# Altium schematic symbol library robopoly.SCHLIB: 56 symbols
Pins are listed as number, name and electrical type; pins without a type are passive.

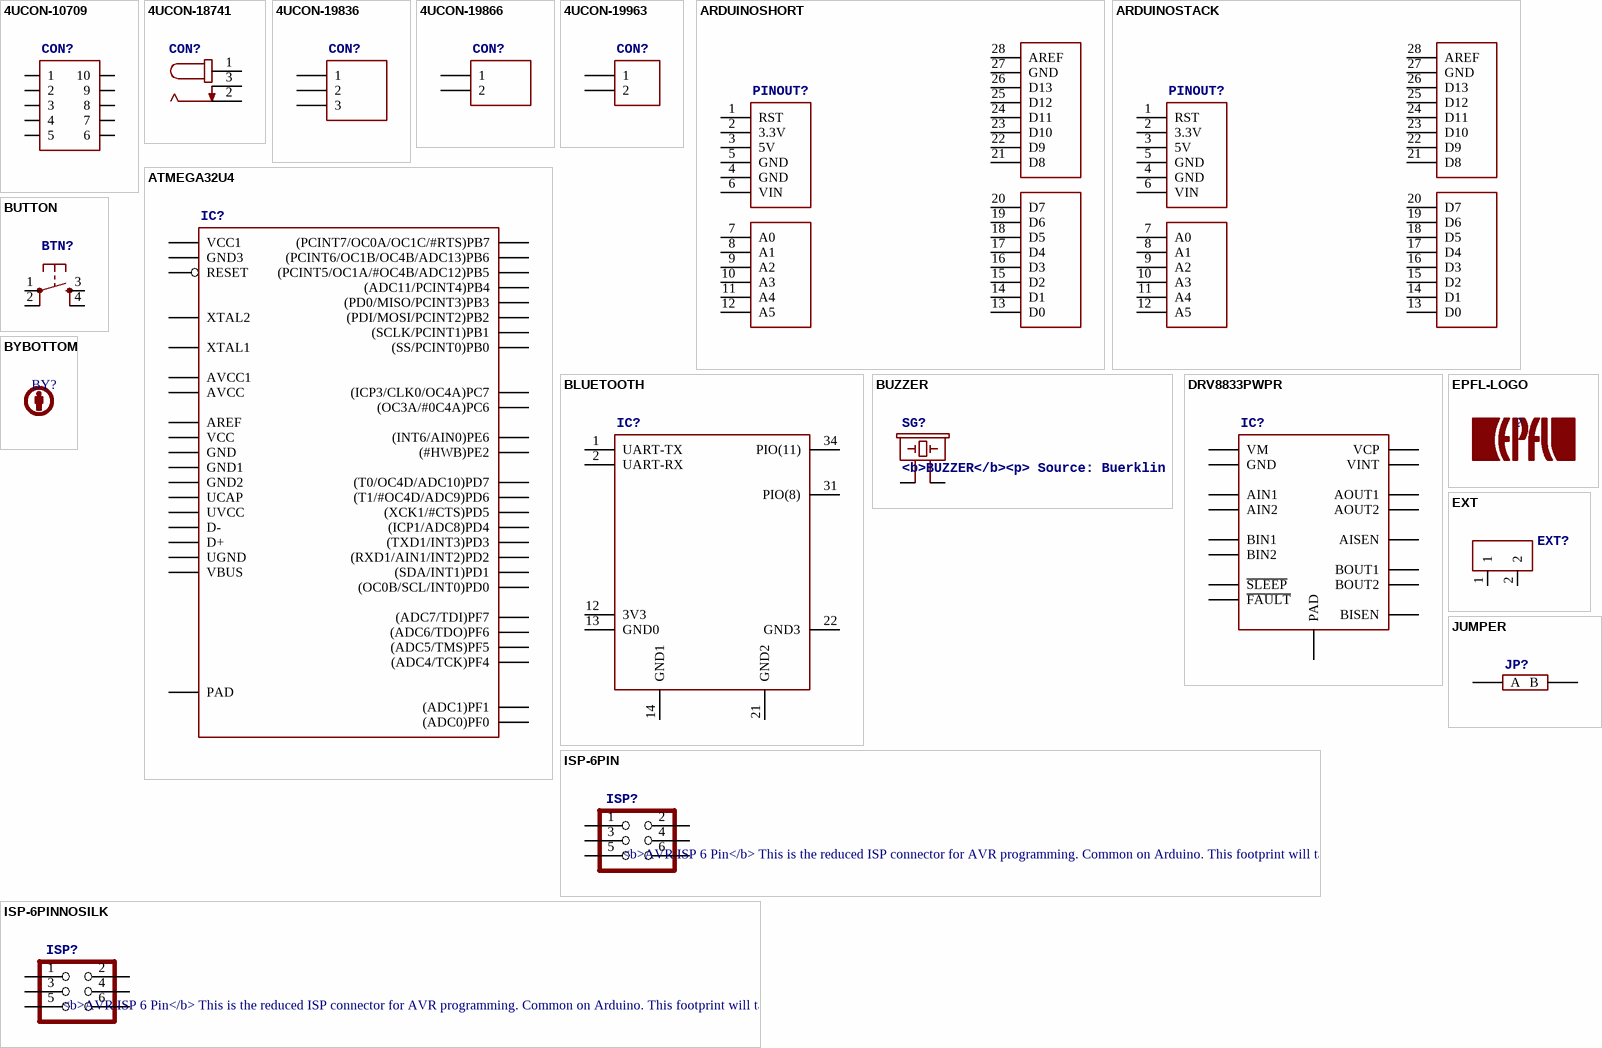
[diagram p0: symbols 4UCON-10709 to JUMPER]

## 4UCON-10709
designator CON?
footprint 4UCON-10709
pins: 1 11 1, 2 12 2, 3 13 3, 4 14 4, 5 15 5, 6 16 6, 7 17 7, 8 18 8, 9 19 9, 10 20 10

## 4UCON-18741
designator CON?
footprint 4UCON-18741
pins: 1, 2, 3

## 4UCON-19836
designator CON?
footprint 4UCON-19836
pins: 1, 2, 3

## 4UCON-19866
designator CON?
footprint 4UCON-19866
pins: P$1 1, P$2 2

## 4UCON-19963
designator CON?
footprint 4UCON-19963
pins: 1, 2

## ARDUINOSHORT
designator PINOUT?
footprint ARDUINO
pins: 1 RST, 2 3.3V (power), 3 5V (power), 4 GND (power), 5 GND (power), 6 VIN, 7 A0, 8 A1, 9 A2, 10 A3, 11 A4, 12 A5, 13 D0, 14 D1, 15 D2, 16 D3, 17 D4, 18 D5, 19 D6, 20 D7, 21 D8, 22 D9, 23 D10, 24 D11, 25 D12, 26 D13, 27 GND (power), 28 AREF

## ARDUINOSTACK
designator PINOUT?
footprint ARDUINO-LONG
pins: 1 RST, 2 3.3V (power), 3 5V (power), 4 GND (power), 5 GND (power), 6 VIN, 7 A0, 8 A1, 9 A2, 10 A3, 11 A4, 12 A5, 13 D0, 14 D1, 15 D2, 16 D3, 17 D4, 18 D5, 19 D6, 20 D7, 21 D8, 22 D9, 23 D10, 24 D11, 25 D12, 26 D13, 27 GND (power), 28 AREF

## ATMEGA32U4
designator IC?
footprint TQFP-44
pins: 1 45 (INT6/AIN0)PE6, 2 46 UVCC (power), 3 47 D-, 4 48 D+, 5 49 UGND (power), 6 50 UCAP, 7 51 VBUS, 8 52 (SS/PCINT0)PB0, 9 53 (SCLK/PCINT1)PB1, 10 54 (PDI/MOSI/PCINT2)PB2, 11 55 (PD0/MISO/PCINT3)PB3, 12 56 (PCINT7/OC0A/OC1C/#RTS)PB7, 13 57 RESET, 14 58 VCC (power), 15 59 GND (power), 16 60 XTAL2, 17 61 XTAL1, 18 62 (OC0B/SCL/INT0)PD0, 19 63 (SDA/INT1)PD1, 20 64 (RXD1/AIN1/INT2)PD2, 21 65 (TXD1/INT3)PD3, 22 66 (XCK1/#CTS)PD5, 23 67 GND1 (power), 24 68 AVCC (power), 25 69 (ICP1/ADC8)PD4, 26 70 (T1/#OC4D/ADC9)PD6, 27 71 (T0/OC4D/ADC10)PD7, 28 72 (ADC11/PCINT4)PB4, 29 73 (PCINT5/OC1A/#OC4B/ADC12)PB5, 30 74 (PCINT6/OC1B/OC4B/ADC13)PB6, 31 75 (OC3A/#0C4A)PC6, 32 76 (ICP3/CLK0/OC4A)PC7, 33 77 (#HWB)PE2, 34 78 VCC1 (power), 35 79 GND2 (power), 36 80 (ADC7/TDI)PF7, 37 81 (ADC6/TDO)PF6, 38 82 (ADC5/TMS)PF5, 39 83 (ADC4/TCK)PF4, 40 84 (ADC1)PF1, 41 85 (ADC0)PF0, 42 86 AREF (power), 43 87 GND3 (power), 44 88 AVCC1 (power), EXP PAD (power)

## BLUETOOTH
designator IC?
footprint BLUETOOTH
pins: 1 UART-TX, 2 UART-RX, 12 3V3, 13 GND0, 14 GND1, 21 GND2, 22 GND3, 31 PIO(8), 34 PIO(11)

## BUTTON
designator BTN?
footprint BUTTON
pins: 1, 2, 3, 4

## BUZZER
designator SG?, comment <b>BUZZER</b><p> Source: Buerklin
OC_FARNELL: unknown; OC_NEWARK: unknown
footprint PS1240P02BT
pins: P$1 1, P$2 2

## BYBOTTOM
designator BY?
footprint BY

## DRV8833PWPR
designator IC?
footprint HTSSOP-16
pins: 1 ~{SLEEP}, 2 AOUT1, 3 AISEN, 4 AOUT2, 5 BOUT2, 6 BISEN, 7 BOUT1, 8 ~{FAULT}, 9 BIN1, 10 BIN2, 11 VCP, 12 VM, 13 GND, 14 VINT, 15 AIN1, 16 AIN2, PAD@1 PAD@2 PAD@3 PAD@4 PAD@5 PAD@6 PAD@7 PAD@8 PAD

## EPFL-LOGO
designator ?

## EXT
designator EXT?
footprint EXT
pins: 1, 2

## ISP-6PIN
designator ISP?, comment <b>AVR ISP 6 Pin</b> / This is the reduced ISP connector for AVR programming. Common on Arduino. This footprint will take up less PCB space and can be used with a 10-pin to 6-pin adapter.
footprint 2X3-NOSILK-STACK
pins: 1, 2, 3, 4, 5, 6

## ISP-6PINNOSILK
designator ISP?, comment <b>AVR ISP 6 Pin</b> / This is the reduced ISP connector for AVR programming. Common on Arduino. This footprint will take up less PCB space and can be used with a 10-pin to 6-pin adapter.
footprint 2X3-NOSILK
pins: 1, 2, 3, 4, 5, 6

## JUMPER
designator JP?
footprint JUMPER
pins: A, B

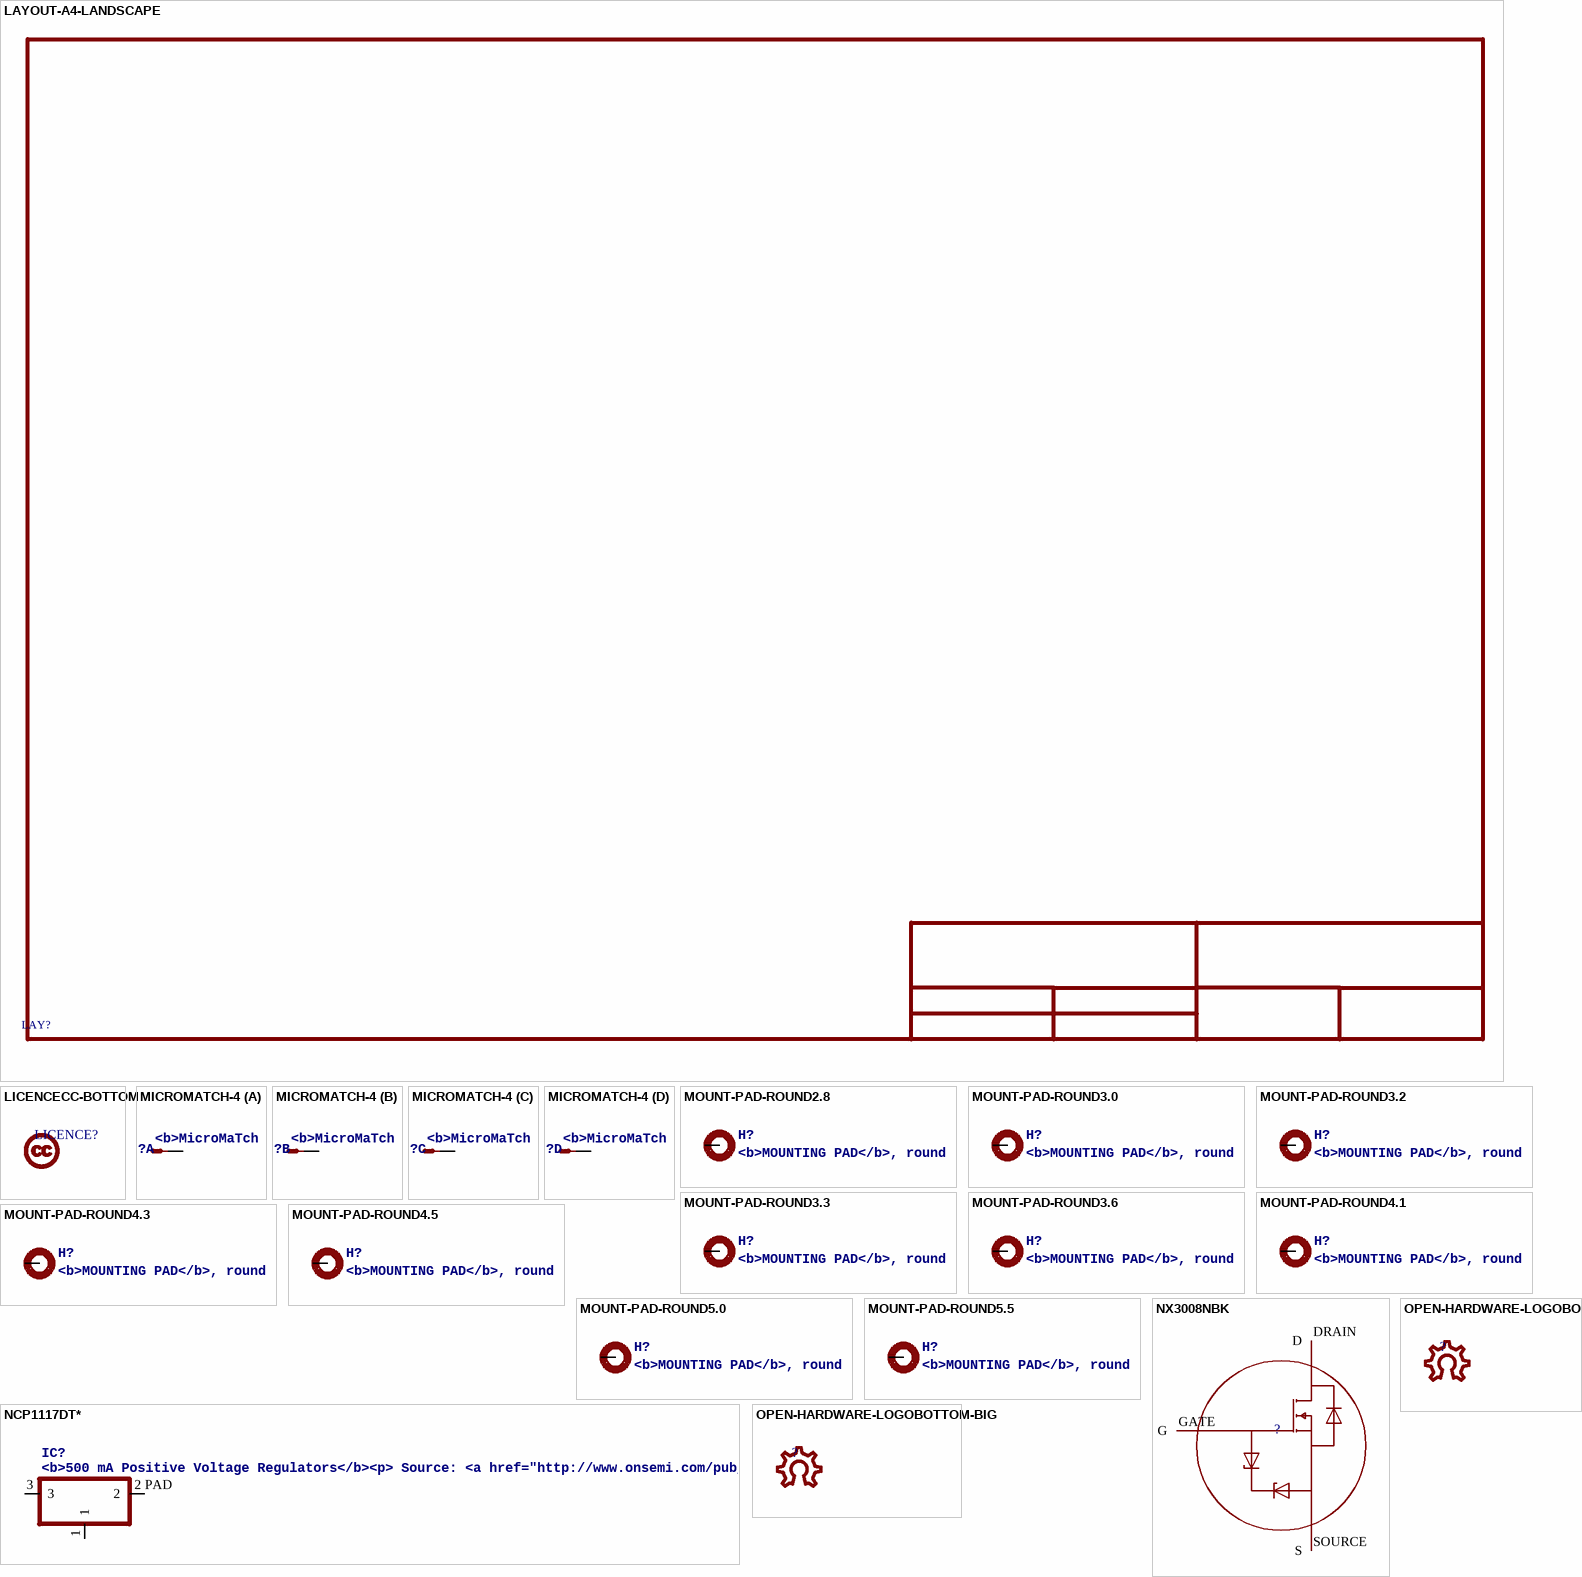
[diagram p1: symbols LAYOUT-A4-LANDSCAPE to OPEN-HARDWARE-LOGOBOTTOM-BIG]

## LAYOUT-A4-LANDSCAPE
designator LAY?

## LICENCECC-BOTTOM
designator LICENCE?
footprint CREATIVE-COMMONS

## MICROMATCH-4
designator X?, comment <b>MicroMaTch 4 </b> 7-215464-4 / 0-215464-4<p> / Drawing Number C-215464<br> / DDEController.pdf
MPN: 7-215464-4; OC_FARNELL: 3784629; OC_NEWARK: 19R8124
footprint MICROMATCH-4
part A pins: 1 S
part B pins: 2 S
part C pins: 3 S
part D pins: 4 S

## MOUNT-PAD-ROUND2.8
designator H?, comment <b>MOUNTING PAD</b>, round
footprint 2,8-PAD
pins: B2,8 MOUNT

## MOUNT-PAD-ROUND3.0
designator H?, comment <b>MOUNTING PAD</b>, round
footprint 3,0-PAD
pins: B3,0 MOUNT

## MOUNT-PAD-ROUND3.2
designator H?, comment <b>MOUNTING PAD</b>, round
footprint 3,2-PAD
pins: B3,2 MOUNT

## MOUNT-PAD-ROUND3.3
designator H?, comment <b>MOUNTING PAD</b>, round
footprint 3,3-PAD
pins: B3,3 MOUNT

## MOUNT-PAD-ROUND3.6
designator H?, comment <b>MOUNTING PAD</b>, round
footprint 3,6-PAD
pins: B3,6 MOUNT

## MOUNT-PAD-ROUND4.1
designator H?, comment <b>MOUNTING PAD</b>, round
footprint 4,1-PAD
pins: B4,1 MOUNT

## MOUNT-PAD-ROUND4.3
designator H?, comment <b>MOUNTING PAD</b>, round
footprint 4,3-PAD
pins: B4,3 MOUNT

## MOUNT-PAD-ROUND4.5
designator H?, comment <b>MOUNTING PAD</b>, round
footprint 4,5-PAD
pins: B4,5 MOUNT

## MOUNT-PAD-ROUND5.0
designator H?, comment <b>MOUNTING PAD</b>, round
footprint 5,0-PAD
pins: B5 MOUNT

## MOUNT-PAD-ROUND5.5
designator H?, comment <b>MOUNTING PAD</b>, round
footprint 5,5-PAD
pins: B5,5 MOUNT

## NCP1117DT*
designator IC?, comment <b>500 mA Positive Voltage Regulators</b><p> / Source: <a href="http://www.onsemi.com/pub_link/Collateral/MC78M00-D.PDF">Data sheet</a>
footprint DPACK_3
pins: 1, 2 PAD 2, 3

## NX3008NBK
designator ?
footprint SOT23
pins: DRAIN D, GATE G, SOURCE S

## OPEN-HARDWARE-LOGOBOTTOM
designator ?
footprint OPEN-HARDWARE-BOTTOM

## OPEN-HARDWARE-LOGOBOTTOM-BIG
designator ?
footprint OPEN-HARDWARE-BOTTOM-BIG

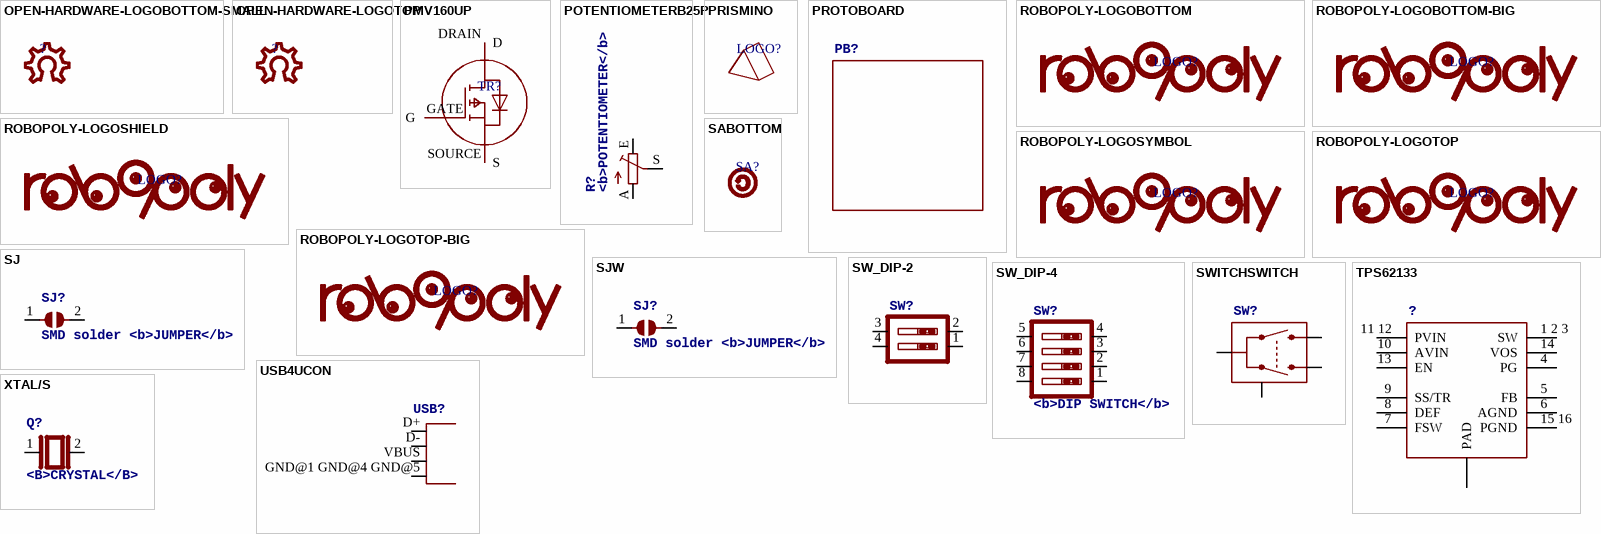
[diagram p2: symbols OPEN-HARDWARE-LOGOBOTTOM-SMALL to XTAL/S]

## OPEN-HARDWARE-LOGOBOTTOM-SMALL
designator ?
footprint OPEN-HARDWARE-BOTTOM-SMALL

## OPEN-HARDWARE-LOGOTOP
designator ?
footprint OPEN-HARDWARE-TOP

## PMV160UP
designator TR?
footprint SOT23
pins: DRAIN D, GATE G, SOURCE S

## POTENTIOMETERB25P
designator R?, comment <b>POTENTIOMETER</b>
footprint B25P
pins: A, E, S

## PRISMINO
designator LOGO?
footprint PRISMINO-LOGO

## PROTOBOARD
designator PB?
footprint PROTOBOARD

## ROBOPOLY-LOGOBOTTOM
designator LOGO?
footprint ROBOPOLY-LOGO-BOTTOM

## ROBOPOLY-LOGOBOTTOM-BIG
designator LOGO?
footprint ROBOPOLY-LOGO-BOTTOM-BIG

## ROBOPOLY-LOGOSHIELD
designator LOGO?
footprint ROBOPOLY-LOGO-SHIELD

## ROBOPOLY-LOGOSYMBOL
designator LOGO?
footprint ROBOPOLY-LOGO-SYMBOL

## ROBOPOLY-LOGOTOP
designator LOGO?
footprint ROBOPOLY-LOGO-TOP

## ROBOPOLY-LOGOTOP-BIG
designator LOGO?
footprint ROBOPOLY-LOGO-TOP-BIG

## SABOTTOM
designator SA?
footprint SA

## SJ
designator SJ?, comment SMD solder <b>JUMPER</b>
footprint SJ
pins: 1, 2

## SJW
designator SJ?, comment SMD solder <b>JUMPER</b>
footprint SJW
pins: 1, 2

## SW_DIP-2
designator SW?
footprint EDG-02
pins: 1, 2, 3, 4

## SW_DIP-4
designator SW?, comment <b>DIP SWITCH</b>
footprint EDG-04
pins: 1, 2, 3, 4, 5, 6, 7, 8

## SWITCHSWITCH
designator SW?
footprint SWITCH
pins: 1, 2, 3, 4 5 P$1 (power)

## TPS62133
designator ?
footprint QFN16
pins: 1 2 3 SW, 4 PG, 5 FB, 6 AGND, 7 FSW, 8 DEF, 9 SS/TR, 10 AVIN, 11 12 PVIN, 13 EN, 14 VOS, 15 16 PGND, PAD

## USB4UCON
designator USB?
footprint USB-MICROB-4UCON
pins: D+, D-, GND@1 GND@4 GND@5 GND, VBUS

## XTAL/S
designator Q?, comment <B>CRYSTAL</B>
footprint QS
pins: 1, 2